# Altium footprint library 元件1.PcbLib: 420 footprints (part 21 of 27)
Each footprint in its own frame and in the unit in brackets; x right, y up, seen from the top. Pads: shape width x height; smd on the part's side, far side on the other; paste and mask are expansions set on the pad; w line width, h text height; cw(c..) or ccw(c..) is an arc to the next point about the centre after c.
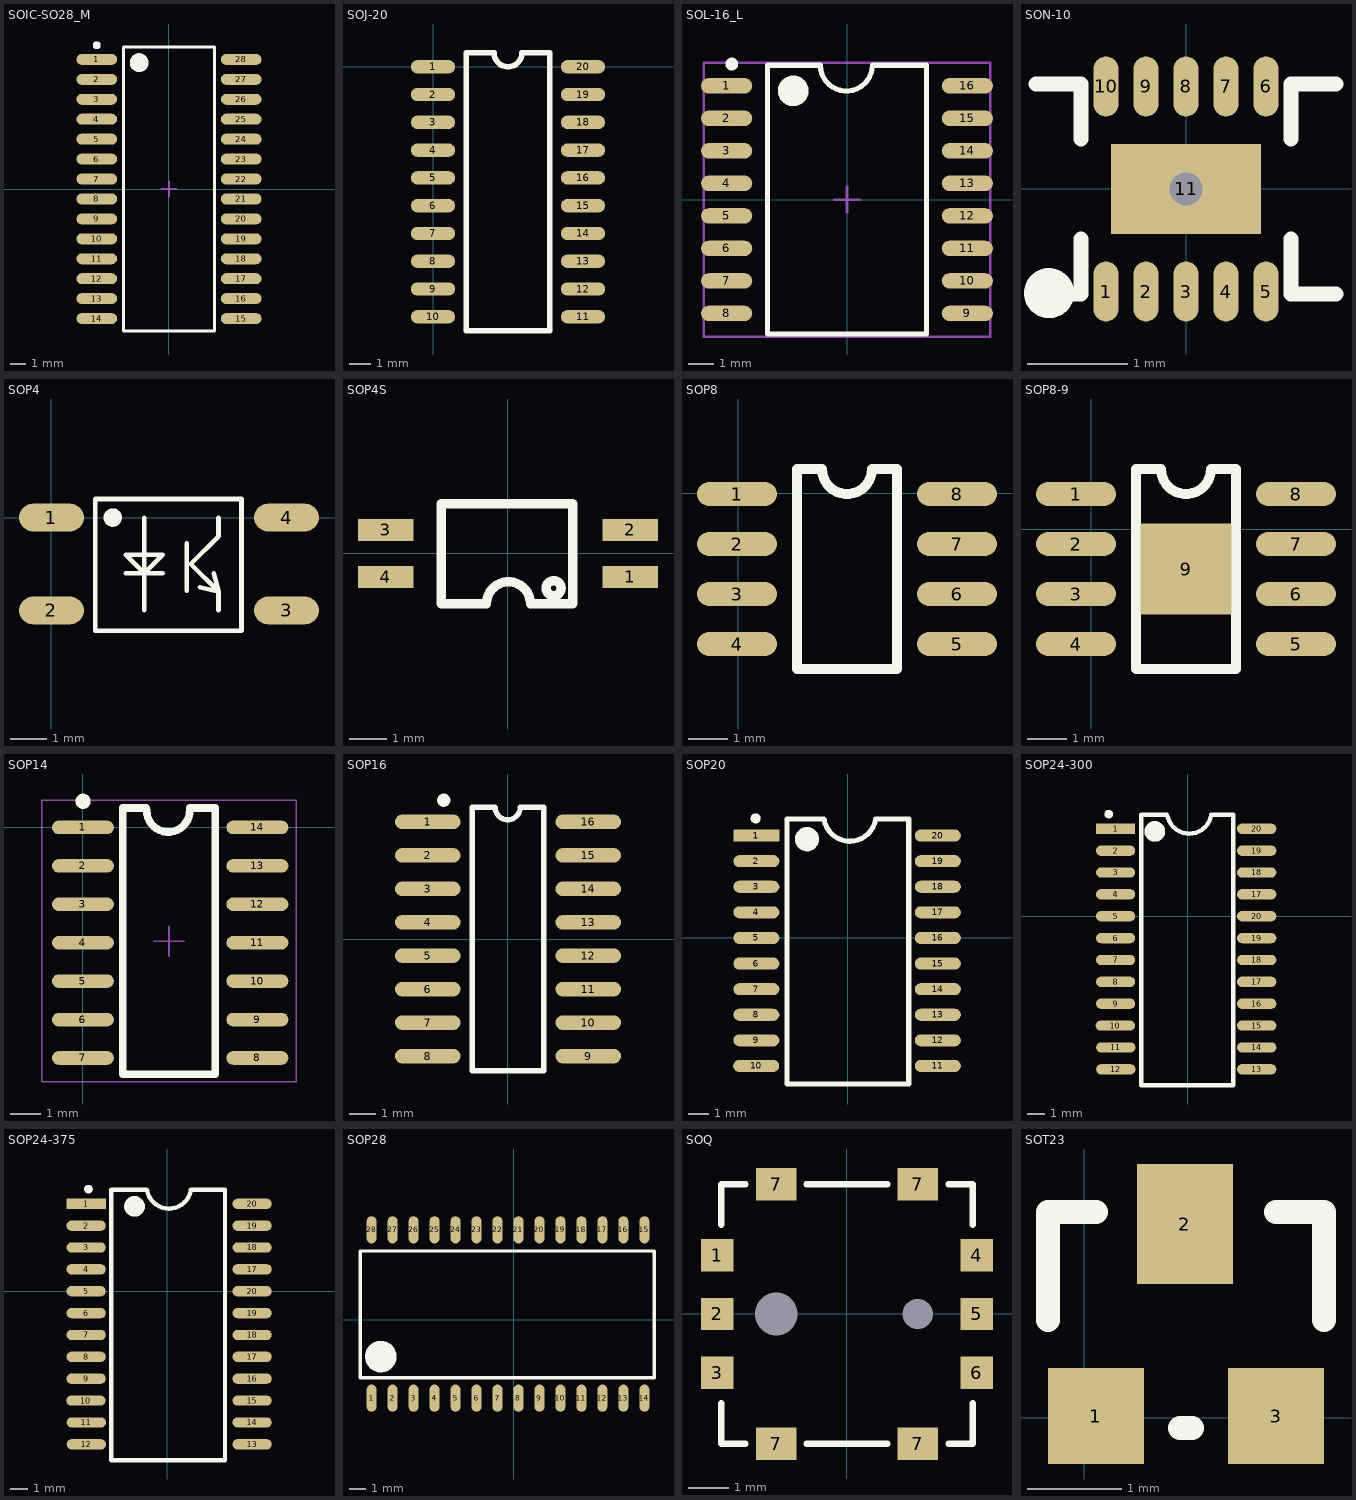
[diagram p20: the footprints below, top view; thin cyan lines are the x and y axes]

## SOIC-SO28_M [mm] "SOIC, 28-Leads, Body 17.9x7.5mm, Pitch 1.27mm, IPC Low Density"
height 2.65
pads (28):
  oval 2.6x0.7 smd: 1(-4.6,8.255) 2(-4.6,6.985) 3(-4.6,5.715) 4(-4.6,4.445) 5(-4.6,3.175) 6(-4.6,1.905) 7(-4.6,0.635) 8(-4.6,-0.635) 9(-4.6,-1.905) 10(-4.6,-3.175) 11(-4.6,-4.445) 12(-4.6,-5.715) 13(-4.6,-6.985) 14(-4.6,-8.255) 15(4.6,-8.255) 16(4.6,-6.985) 17(4.6,-5.715) 18(4.6,-4.445) 19(4.6,-3.175) 20(4.6,-1.905) 21(4.6,-0.635) 22(4.6,0.635) 23(4.6,1.905) 24(4.6,3.175) 25(4.6,4.445) 26(4.6,5.715) 27(4.6,6.985) 28(4.6,8.255)
Top Overlay:
  circle w0.25: c-4.6,9.155 r0.125
  circle w0.6: c-1.9,8.05 r0.3
  lines w0.2: -2.9,-9.05 -2.9,9.05 2.9,9.05 2.9,-9.05 -2.9,-9.05
Mechanical 15:
  lines w0.1: -0.5,0 0.5,0 ; 0,-0.5 0,0.5
3D body "User Library-80072036 SO28.STEP": height 2.63, standoff -0.01, extent -5.36,-9.012 5.31,9.068

## SOJ-20 [mil]
pads (20):
  oval 80x24 smd: 1(0,0) 2(0,-50) 3(0,-100) 4(0,-150) 5(0,-200) 6(0,-250) 7(0,-300) 8(0,-350) 9(0,-400) 10(0,-450) 11(270,-450) 12(270,-400) 13(270,-350) 14(270,-300) 15(270,-250) 16(270,-200) 17(270,-150) 18(270,-100) 19(270,-50) 20(270,0)
Top Overlay:
  lines w10: 60,-475 210,-475 210,25 160,25 cw(c135,25) 110,25 60,25 60,-475
3D body "Soj20.STEP": height 78.74, standoff 0, extent -6.64,-468.36 275.4,23.77

## SOL-16_L [mm] "16-Pin Small Outline Integrated Circuit 1.27 mm Pitch, IPC High Density"
height 2.65
pads (16):
  oval 2x0.6 smd: 1(-4.7,4.445) 2(-4.7,3.175) 3(-4.7,1.905) 4(-4.7,0.635) 5(-4.7,-0.635) 6(-4.7,-1.905) 7(-4.7,-3.175) 8(-4.7,-4.445) 9(4.7,-4.445) 10(4.7,-3.175) 11(4.7,-1.905) 12(4.7,-0.635) 13(4.7,0.635) 14(4.7,1.905) 15(4.7,3.175) 16(4.7,4.445)
Top Overlay:
  circle w0.6: c-2.1,4.25 r0.3
  circle w0.25: c-4.5,5.295 r0.125
  lines w0.2: -1.084,5.25 -3.1,5.25 -3.1,-5.25 3.1,-5.25 3.1,5.25 1.008,5.25 ; -1.042,5.25 ccw(c-0.025,5.258) 0.991,5.258
Mechanical 15:
  lines w0.1: -0.5,0 0.5,0 ; 0,-0.5 0,0.5 ; -5.6,-5.35 5.6,-5.35 5.6,5.35 -5.6,5.35 -5.6,-5.35
3D body "User Library-SOIC16-300.STEP": height 2.65, standoff 0, extent -5.182,-5.144 5.118,5.156

## SON-10 [mm]
height 0.8
pads (11):
  oval 0.25x0.6 smd: 1(-0.8,-1.025) 2(-0.4,-1.025) 3(0,-1.025) 4(0.4,-1.025) 5(0.8,-1.025) 6(0.8,1.025) 7(0.4,1.025) 8(0,1.025) 9(-0.4,1.025) 10(-0.8,1.025)
  rect 1.5x0.9 smd: 11(0,0)
via 0,0 diameter 0.66 hole 0.33
Top Overlay:
  circle w0.25: c-1.37,-1.041 r0.125
  lines w0.152: -1.5,-1.05 -1.05,-1.05 -1.05,-0.5 ; -1.5,1.05 -1.05,1.05 -1.05,0.5 ; 1.05,-0.5 1.05,-1.05 1.5,-1.05 ; 1.05,0.5 1.05,1.05 1.5,1.05
3D body "SON-10.STEP": height 0.8, standoff 0, extent -1.05,-1.055 1.05,1.055

## SOP4 [mil] "AQY211G2S"
pads (4):
  oval 70x30 smd: 1(0,0) 2(0,-100) 3(253.23,-100) 4(253.23,0)
Top Overlay:
  circle w10: c65.94,0 r4.92
  lines w5: 80,-60 120,-60 ; 100,-100 100,0 ; 145.67,-78.74 145.67,-27.56 ; 160,-75 180,-80 ; 175,-60 180,-80 ; 180,-100 180,-80 ; 180,0 180,-20 150,-50 180,-80 ; 47.24,-121.73 204.72,-121.73 204.72,20 47.24,20 47.24,-121.73 ; 80,-40 100,-60 120,-40 80,-40
3D body "User Library-HCPL-181-1.STEP": height 78.74, standoff -3.96, extent -7.87,-122.05 267.72,19.69

## SOP4S [mm]
pads (4):
  rect 1.5x0.6 smd: 1(3.31,-0.635) 2(3.31,0.635) 3(-3.309,0.635) 4(-3.309,-0.635)
Top Overlay:
  circle w0.254: c1.235,-0.94 r0.203
  lines w0.254: -1.805,-1.361 -1.805,1.346 ; -1.794,-1.361 -0.582,-1.361 cw(c0.013,-1.361) 0.608,-1.361 1.751,-1.361 1.751,1.346 -1.786,1.346
3D body "SOP-4-1.step": height 2.1, standoff 0, extent -3.492,-1.397 3.507,1.403

## SOP8 [mil]
pads (8):
  oval 80x24 smd: 1(-1,-1) 2(-1,-51) 3(-1,-101) 4(-1,-151) 5(219,-151) 6(219,-101) 7(219,-51) 8(219,-1)
Top Overlay:
  lines w10: 59,-176 59,24 84,24 ccw(c109,24) 134,24 159,24 159,-176 59,-176
3D body "SOP8.STEP": height 62.99, standoff 0, extent -8.7,-173.62 229.17,24.02

## SOP8-9 [mil]
pads (9):
  oval 80x24 smd: 1(-15,35) 2(-15,-15) 3(-15,-65) 4(-15,-115) 5(205,-115) 6(205,-65) 7(205,-15) 8(205,35)
  rect 90.55x90.55 smd: 9(95,-40)
Top Overlay:
  lines w10: 45,-140 45,60 70,60 ccw(c95,60) 120,60 145,60 145,-140 45,-140
3D body "User Library-sop-8.STEP": height 62.99, standoff 0, extent -23.94,-138.82 213.93,58.82

## SOP14 [mm] "LM339"
height 1.8
pads (14):
  oval 2.05x0.45 smd mask+0.1: 1(0,0) 2(0,-1.27) 3(0,-2.54) 4(0,-3.81) 5(0,-5.08) 6(0,-6.35) 7(0,-7.62) 8(5.766,-7.62) 9(5.766,-6.35) 10(5.766,-5.08) 11(5.766,-3.81) 12(5.766,-2.54) 13(5.766,-1.27) 14(5.766,0)
Top Overlay:
  circle w0.25: c0.002,0.864 r0.125
  lines w0.254: 2.082,0.641 1.32,0.641 1.32,-8.159 4.37,-8.159 4.37,0.641 3.531,0.641 ; 2.108,0.559 ccw(c2.819,0.559) 3.53,0.583
Mechanical 15:
  lines w0.051: 2.345,-3.759 3.345,-3.759 ; 2.845,-4.259 2.845,-3.259 ; -1.355,-8.409 7.045,-8.409 7.045,0.891 -1.355,0.891 -1.355,-8.409
3D body "SOP14.STEP": height 1.61, standoff 0, extent -0.306,-8.16 5.894,0.54

## SOP16 [mm] "SOP, 16-Leads, Body 9.90x3.90mm, Pitch 1.27mm, IPC Medium Density"
height 1.75
pads (16):
  oval 2.5x0.55 smd: 1(-3.035,4.445) 2(-3.035,3.175) 3(-3.035,1.905) 4(-3.035,0.635) 5(-3.035,-0.635) 6(-3.035,-1.905) 7(-3.035,-3.175) 8(-3.035,-4.445) 9(3.06,-4.445) 10(3.06,-3.175) 11(3.06,-1.905) 12(3.06,-0.635) 13(3.06,0.635) 14(3.06,1.905) 15(3.06,3.175) 16(3.06,4.445)
Top Overlay:
  circle w0.25: c-2.425,5.27 r0.125
  lines w0.2: -0.483,5 -1.346,5 -1.346,-5 1.372,-5 1.372,5 0.475,5 ; -0.475,4.997 ccw(c0,4.996) 0.475,4.997
3D body "SO-16.step": height 1.45, standoff 0, extent -2.927,-4.978 2.978,5.004

## SOP20 [mm]
height 2.36
pads (20):
  rect 2.286x0.6 smd: 1(-4.534,5.08)
  oval 2.286x0.6 smd: 2(-4.534,3.81) 3(-4.534,2.54) 4(-4.534,1.27) 5(-4.534,0) 6(-4.534,-1.27) 7(-4.534,-2.54) 8(-4.534,-3.81) 9(-4.534,-5.08) 10(-4.544,-6.35) 11(4.465,-6.35) 12(4.465,-5.08) 13(4.465,-3.81) 14(4.465,-2.54) 15(4.465,-1.27) 16(4.465,0) 17(4.465,1.27) 18(4.465,2.54) 19(4.465,3.81) 20(4.465,5.08)
Top Overlay:
  circle w0.6: c-2.025,4.9 r0.3
  circle w0.25: c-4.575,5.93 r0.125
  lines w0.254: -1.194,5.9 -3.025,5.9 -3.025,-7.239 3.025,-7.239 3.025,5.9 1.372,5.9 ; -1.17,5.844 ccw(c0.101,6.094) 1.372,5.842
3D body "User Library-SO-20 (Wide).step": height 2.7, standoff 0, extent -5.15,-7.009 5.15,5.791

## SOP24-300 [mil]
height 92.91
pads (24):
  rect 90x23.62 smd: 1(-164.5,200)
  oval 90x23.62 smd: 2(-164.5,150) 3(-164.5,100) 4(-164.5,50) 5(-164.5,0) 6(-164.5,-50) 7(-164.5,-100) 8(-164.5,-150) 9(-164.5,-200) 10(-164.9,-250) 11(-164,-300) 12(-164,-350) 13(158,-350) 14(158,-300) 15(158,-250) 16(158,-200) 17(158,-150) 17(158,50) 18(158,-100) 18(158,100) 19(158,-50) 19(158,150) 20(158,0) 20(158,200)
Top Overlay:
  circle w23.62: c-74.81,194 r11.81
  circle w9.84: c-180.12,233.46 r4.92
  lines w10: -47,232.28 -106,232.28 -106,-386 105,-386 105,232.28 54,232.28 ; -46.07,230.07 ccw(c3.97,239.91) 54,230

## SOP24-375 [mil]
height 92.91
pads (24):
  rect 90x23.62 smd: 1(-185.5,200)
  oval 90x23.62 smd: 2(-185.5,150) 3(-185.5,100) 4(-185.5,50) 5(-185.5,0) 6(-185.5,-50) 7(-185.5,-100) 8(-185.5,-150) 9(-185.5,-200) 10(-185.9,-250) 11(-185,-300) 12(-185,-350) 13(194,-350) 14(194,-300) 15(194,-250) 16(194,-200) 17(194,-150) 17(194,50) 18(194,-100) 18(194,100) 19(194,-50) 19(194,150) 20(194,0) 20(194,200)
Top Overlay:
  circle w9.84: c-180.12,233.46 r4.92
  circle w23.62: c-74.81,194 r11.81
  lines w10: -47,232.28 -128,232.28 -128,-386 132,-386 132,232.28 54,232.28 ; -46.07,230.07 ccw(c3.97,239.91) 54,230
3D body "SOP24.STEP": height 74.8, standoff 1.06, extent -203,-383.99 209,234

## SOP28 [mm]
pads (28):
  oval 0.6x1.65 smd: 1(-8.594,-4.754) 2(-7.324,-4.754) 3(-6.054,-4.754) 4(-4.784,-4.754) 5(-3.514,-4.754) 6(-2.244,-4.754) 7(-0.974,-4.754) 8(0.296,-4.754) 9(1.566,-4.754) 10(2.836,-4.754) 11(4.106,-4.754) 12(5.376,-4.754) 13(6.646,-4.754) 14(7.916,-4.754) 15(7.916,5.431) 16(6.646,5.431) 17(5.376,5.431) 18(4.106,5.431) 19(2.836,5.431) 20(1.566,5.431) 21(0.296,5.431) 22(-0.974,5.431) 23(-2.244,5.431) 24(-3.514,5.431) 25(-4.784,5.431) 26(-6.054,5.431) 27(-7.324,5.431) 28(-8.594,5.431)
Top Overlay:
  circle w1: c-8.035,-2.239 r0.457
  lines w0.203: -9.284,4.127 -9.284,-3.514 8.517,-3.514 8.517,4.149 -9.199,4.149
3D body "SO28.step": height 2.59, standoff -0.05, extent -9.423,-4.903 8.657,5.767

## SOQ [mm]
height 0.127
pads (12):
  rect 0.8x0.8 smd: 1(-3.2,1.45) 2(-3.2,0) 3(-3.2,-1.45) 4(3.2,1.45) 5(3.2,0) 6(3.2,-1.45)
  rect 1x0.8 smd: 7(-1.75,-3.2) 7(-1.75,3.2) 7(1.75,-3.2) 7(1.75,3.2)
  round 0 hole 1.05: ""(-1.75,0)
  round 0 hole 0.75: ""(1.75,0)
Top Overlay:
  lines w0.152: -3.1,-2.2 -3.1,-3.2 -2.5,-3.2 ; -3.1,2.2 -3.1,3.2 -2.5,3.2 ; -1,-3.2 1,-3.2 ; -1,3.2 1,3.2 ; 2.5,-3.2 3.1,-3.2 3.1,-2.2 ; 2.5,3.2 3.1,3.2 3.1,2.2
3D body "SOQ.STEP": height 5, standoff -0.5, extent -3.322,-3.2 3.322,3.2

## SOT23 [mil]
pads (3):
  rect 40x40 smd: 1(4.88,0.63) 3(79.88,0.63)
  rect 40x50 smd: 2(41.88,80.63)
Top Overlay:
  lines w10: -15.12,40.63 -15.12,85.63 4.88,85.63 ; 39.88,-4.37 44.88,-4.37 ; 79.88,85.63 99.88,85.63 99.88,40.63
3D body "SOT-23-3.STEP": height 47.24, standoff 0, extent -14.87,-11.02 99.3,99.22